# Altium footprint library GyokuRe.PcbLib: 1248 footprints (part 51 of 78)
Each footprint in its own frame and in the unit in brackets; x right, y up, seen from the top. Pads: shape width x height; smd on the part's side, far side on the other; paste and mask are expansions set on the pad; w line width, h text height; cw(c..) or ccw(c..) is an arc to the next point about the centre after c.
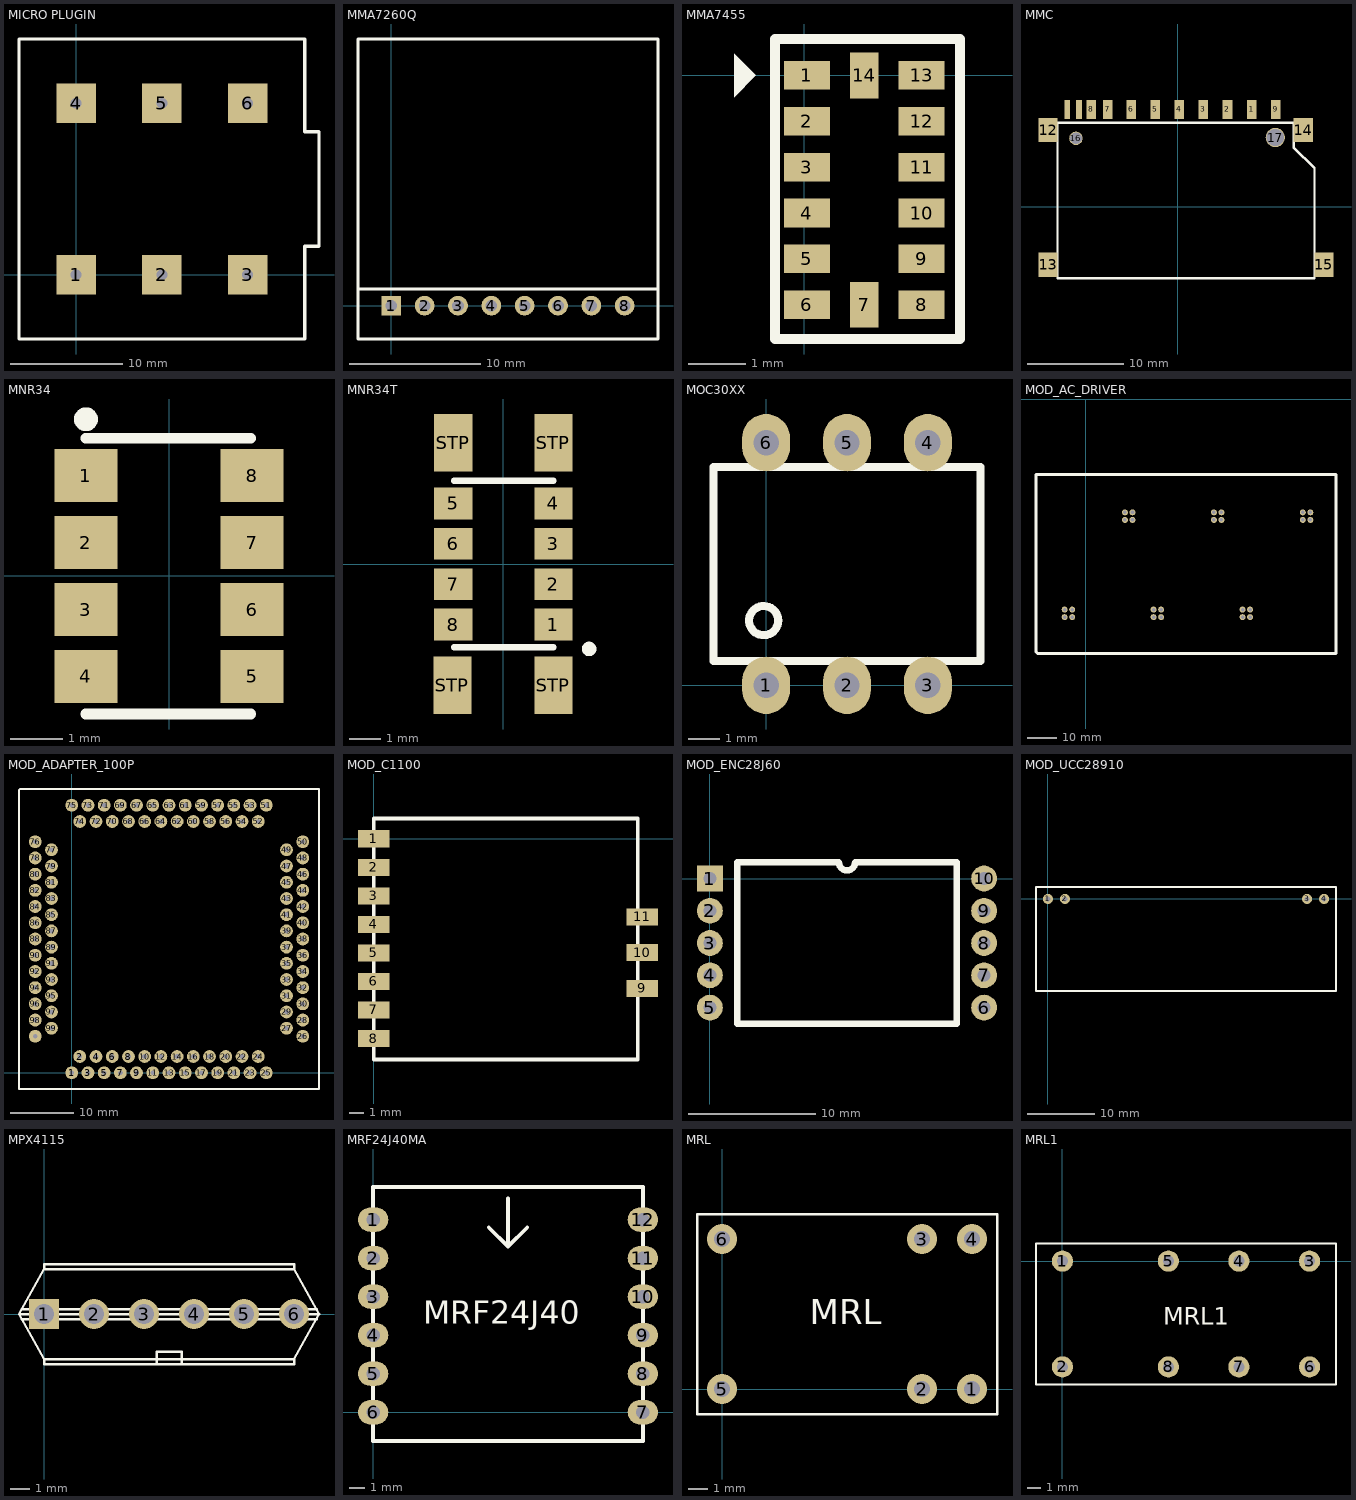
[diagram p50: the footprints below, top view; thin cyan lines are the x and y axes]

## MICRO PLUGIN [mil]
pads (6):
  rect 137.8x137.8 / inner round 62 / far side rect 137.8x137.8 hole 38: 1(0,0) 2(300,0) 3(600,0) 4(0,600) 5(300,600) 6(600,600)
Top Overlay:
  lines w11.82: -200,-225 800,-225 800,100 850,100 850,500 800,500 800,825 -200,825 -200,-225

## MMA7260Q [mm] "Connector; Header; 8 Position"
pads (8):
  rect 1.5x1.5 hole 0.9: 1(0,0)
  round 1.5 hole 0.9: 2(2.54,0) 3(5.08,0) 4(7.62,0) 5(10.16,0) 6(12.7,0) 7(15.24,0) 8(17.78,0)
Top Overlay:
  lines w0.2: -2.54,1.27 20.32,1.27 ; -2.54,-2.54 20.32,-2.54 20.32,20.32 -2.54,20.32 -2.54,-2.54
3D body: height 1, standoff 0, extent -2.54,-2.54 20.32,20.32
3D body: height 2, standoff 1, extent 7.62,7.62 13.97,13.97

## MMA7455 [mm]
pads (14):
  rect 0.8x0.5 smd: 1(0.051,0) 2(0.051,-0.8) 3(0.051,-1.6) 4(0.051,-2.4) 5(0.051,-3.2) 6(0.051,-4) 8(2.051,-4) 9(2.051,-3.2) 10(2.051,-2.4) 11(2.051,-1.6) 12(2.051,-0.8) 13(2.051,0)
  rect 0.5x0.8 smd: 7(1.051,-4) 14(1.051,0)
Top Overlay:
  region: -1.219,0.381 -0.838,0 -1.219,-0.381
  lines w0.178: -0.508,-4.572 -0.508,0.635 2.718,0.635 2.718,-4.597 ; 2.718,-4.597 -0.508,-4.597 2.718,-4.597

## MMC [mm]
pads (17):
  rect 1x2 smd: 1(7.67,10.109) 2(5.17,10.109) 3(2.67,10.109) 4(0.17,10.109) 5(-2.33,10.109) 6(-4.83,10.109) 7(-7.255,10.109) 8(-8.955,10.109) 9(10.17,10.109)
  rect 0.6x2 smd: 10(-10.255,10.109) 11(-11.455,10.109)
  rect 2x2.5 smd: 12(-13.455,7.95) 13(-13.455,-6.02) 14(13.024,7.95) 15(15.183,-6.02)
  round 1.4 hole 1.2: 16(-10.555,7.109)
  round 2 hole 1.8: 17(10.135,7.188)
Top Overlay:
  lines w0.254: -12.471,-7.417 14.199,-7.417 14.199,4.013 12.04,6.172 12.04,8.712 -12.471,8.712 -12.471,-7.417
3D body "User Library-SD Kart.step": height 3, standoff -1, extent -13.436,-20.196 15.164,9.804

## MNR34 [mm]
pads (8):
  rect 1.2x1 smd: 1(-1.578,1.898) 2(-1.578,0.628) 3(-1.578,-0.642) 4(-1.578,-1.912) 5(1.572,-1.912) 6(1.572,-0.642) 7(1.572,0.628) 8(1.572,1.898)
Top Overlay:
  circle w0.254: c-1.578,2.965 r0.1
  lines w0.2: -1.578,-2.623 1.546,-2.623 ; -1.578,2.609 1.546,2.609
3D body: height 1.27, standoff 0, extent -2.032,-2.286 2.032,2.286

## MNR34T [mm]
pads (12):
  rect 1.2x1 smd: 1(1.575,-1.896) 2(1.575,-0.626) 3(1.575,0.644) 4(1.575,1.914) 5(-1.575,1.914) 6(-1.575,0.644) 7(-1.575,-0.626) 8(-1.575,-1.896)
  rect 1.2x1.8 smd: STP(-1.6,-3.801) STP(-1.575,3.819) STP(1.575,-3.801) STP(1.575,3.819)
Top Overlay:
  circle w0.254: c2.694,-2.658 r0.1
  lines w0.2: -1.549,-2.607 1.575,-2.607 ; -1.549,2.625 1.575,2.625
3D body: height 2, standoff 0, extent -1.649,-2.707 1.675,2.725

## MOC30XX [mm]
pads (6):
  oval 1.5x1.8 hole 0.8: 1(0,0) 2(2.54,0) 3(5.08,0) 4(5.08,7.62) 5(2.54,7.62) 6(0,7.62)
Top Overlay:
  circle w0.254: c-0.077,2.032 r0.458
  lines w0.254: -1.651,0.762 -1.651,6.858 6.731,6.858 6.731,0.762 -1.651,0.762
3D body "SW3DPS-DIP6-DEFAULT.step": height 4.41, standoff -3.18, extent -1.5,-0.19 6.58,7.81

## MOD_AC_DRIVER [mm] "6 switch for 3 phase"
pads (24):
  round 2 hole 1.2: 1(-7.112,-71.12) 2(-4.572,-71.12) 3(22.86,-71.12) 4(25.4,-71.12) 5(52.832,-71.12) 6(55.372,-71.12) 7(13.208,-40.894) 8(15.748,-40.894) 9(43.18,-40.894) 10(45.72,-40.894) 11(73.152,-40.894) 12(75.692,-40.894) 13(-7.112,-73.66) 14(-4.572,-73.66) 15(22.86,-73.66) 16(25.4,-73.66) 17(52.832,-73.66) 18(55.372,-73.66) 19(13.208,-38.354) 20(15.748,-38.354) 21(43.18,-38.354) 22(45.72,-38.354) 23(73.152,-38.354) 24(75.692,-38.354)
Top Overlay:
  lines w1: -16.764,-83.566 -16.764,-25.654 84.328,-25.654 84.328,-85.852 -16.256,-85.852 -16.764,-85.344 -16.764,-83.312

## MOD_ADAPTER_100P [mm] "adapter 100pin for dspic33"
pads (100):
  round 2 hole 0.762: 1(0,0) 2(1.27,2.54) 3(2.54,0) 4(3.81,2.54) 5(5.08,0) 6(6.35,2.54) 7(7.62,0) 8(8.89,2.54) 9(10.16,0) 10(11.43,2.54) 11(12.7,0) 12(13.97,2.54) 13(15.24,0) 14(16.51,2.54) 15(17.78,0) 16(19.05,2.54) 17(20.32,0) 18(21.59,2.54) 19(22.86,0) 20(24.13,2.54) 21(25.4,0) 22(26.67,2.54) 23(27.94,0) 24(29.21,2.54) 25(30.48,0) 26(36.195,5.715) 27(33.655,6.985) 28(36.195,8.255) 29(33.655,9.525) 30(36.195,10.795) 31(33.655,12.065) 32(36.195,13.335) 33(33.655,14.605) 34(36.195,15.875) 35(33.655,17.145) 36(36.195,18.415) 37(33.655,19.685) 38(36.195,20.955) 39(33.655,22.225) 40(36.195,23.495) 41(33.655,24.765) 42(36.195,26.035) 43(33.655,27.305) 44(36.195,28.575) 45(33.655,29.845) 46(36.195,31.115) 47(33.655,32.385) 48(36.195,33.655) 49(33.655,34.925) 50(36.195,36.195) 51(30.48,41.91) 52(29.21,39.37) 53(27.94,41.91) 54(26.67,39.37) 55(25.4,41.91) 56(24.13,39.37) 57(22.86,41.91) 58(21.59,39.37) 59(20.32,41.91) 60(19.05,39.37) 61(17.78,41.91) 62(16.51,39.37) 63(15.24,41.91) 64(13.97,39.37) 65(12.7,41.91) 66(11.43,39.37) 67(10.16,41.91) 68(8.89,39.37) 69(7.62,41.91) 70(6.35,39.37) 71(5.08,41.91) 72(3.81,39.37) 73(2.54,41.91) 74(1.27,39.37) 75(0,41.91) 76(-5.715,36.195) 77(-3.175,34.925) 78(-5.715,33.655) 79(-3.175,32.385) 80(-5.715,31.115) 81(-3.175,29.845) 82(-5.715,28.575) 83(-3.175,27.305) 84(-5.715,26.035) 85(-3.175,24.765) 86(-5.715,23.495) 87(-3.175,22.225) 88(-5.715,20.955) 89(-3.175,19.685) 90(-5.715,18.415) 91(-3.175,17.145) 92(-5.715,15.875) 93(-3.175,14.605) 94(-5.715,13.335) 95(-3.175,12.065) 96(-5.715,10.795) 97(-3.175,9.525) 98(-5.715,8.255) 99(-3.175,6.985) 100(-5.715,5.715)
Top Overlay:
  lines w0.254: -8.255,-2.54 38.735,-2.54 38.735,44.45 -8.128,44.45 -8.255,44.323 -8.255,-2.54

## MOD_C1100 [mm] "TI Wireless Module"
pads (11):
  rect 2.2x1.2 smd: 1(0,0) 2(0,-2.007) 3(0,-4.013) 4(0,-6.02) 5(0,-8.026) 6(0,-10.033) 7(0,-12.04) 8(0,-14.046) 9(18.898,-10.516) 10(18.898,-8.001) 11(18.898,-5.486)
Top Overlay:
  lines w0.254: 0,-15.519 18.567,-15.519 18.567,1.422 0,1.422 0,-15.519

## MOD_ENC28J60 [mil]
pads (10):
  rect 80x80 hole 40: 1(0,0)
  round 80 hole 40: 2(0,-100) 3(0,-200) 4(0,-300) 5(0,-400) 6(850,-400) 7(850,-300) 8(850,-200) 9(850,-100) 10(850,0)
Top Overlay:
  lines w20: 85,-450 85,50 400,50 ccw(c425,50) 450,50 765,50 765,-450 85,-450

## MOD_UCC28910 [mil]
pads (4):
  round 60 hole 30: 1(0,0) 2(100,0) 3(1520,0) 4(1620,0)
Top Overlay:
  lines w10: -70,-540 -70,70 1690,70 1690,-540 -70,-540

## MPX4115 [mil]
pads (6):
  rect 60x60 hole 39.37 unplated: 1(0,0)
  round 60 hole 39.37 unplated: 2(100,0) 3(200,0) 4(300,0) 5(400,0) 6(500,0)
Top Overlay:
  lines w5: -45,-10 545,-10 ; -45,10 545,10 ; 225,-100 225,-75 275,-75 275,-100 ; -50,0 550,0 ; -50,0 0,-90 ; -50,0 0,90 ; 0,-90 500,-90 ; 0,-90 0,-100 500,-100 500,-90 ; 0,90 0,100 500,100 500,90 ; 0,90 500,90 ; 500,-90 550,0 ; 500,90 550,0

## MRF24J40MA [mm] "Microchip Zigbee Module"
pads (12):
  oval 2x1.6 hole 0.9: 1(0,12.7) 2(0,10.16) 3(0,7.62) 4(0,5.08) 5(0,2.54) 6(0,0) 7(17.78,0) 8(17.78,2.54) 9(17.78,5.08) 10(17.78,7.62) 11(17.78,10.16) 12(17.78,12.7)
Top Overlay:
  lines w0.254: 0,8.255 0,-1.905 ; 7.62,12.192 8.89,10.922 ; 8.89,14.097 8.89,10.922 ; 10.16,12.192 8.89,10.922 ; 0,-1.905 0,14.859 17.78,14.859 17.78,-1.905 0,-1.905
  text "MRF24J40" at 3.302,5.842 h1.52

## MRL [mil]
pads (6):
  round 60 hole 31.49 unplated: 1(500,0) 2(400,0) 3(400,300) 4(500,300) 5(0,0) 6(0,300)
Top Overlay:
  lines w5: -50,-50 550,-50 550,350 -50,350 -50,-50
  text "MRL" at 175,130 h50

## MRL1 [mil]
pads (8):
  round 60 hole 31.49: 1(0,0) 2(0,-300) 3(700,0) 4(500,0) 5(300,0) 6(700,-300) 7(500,-300) 8(300,-300)
Top Overlay:
  lines w5: -75,-350 775,-350 775,50 -75,50 -75,-350
  text "MRL1" at 285,-180 h50